# Altium footprint library Semiconductor.PcbLib: 73 footprints (part 4 of 5)
Each footprint in its own frame and in the unit in brackets; x right, y up, seen from the top. Pads: shape width x height; smd on the part's side, far side on the other; paste and mask are expansions set on the pad; w line width, h text height; cw(c..) or ccw(c..) is an arc to the next point about the centre after c.
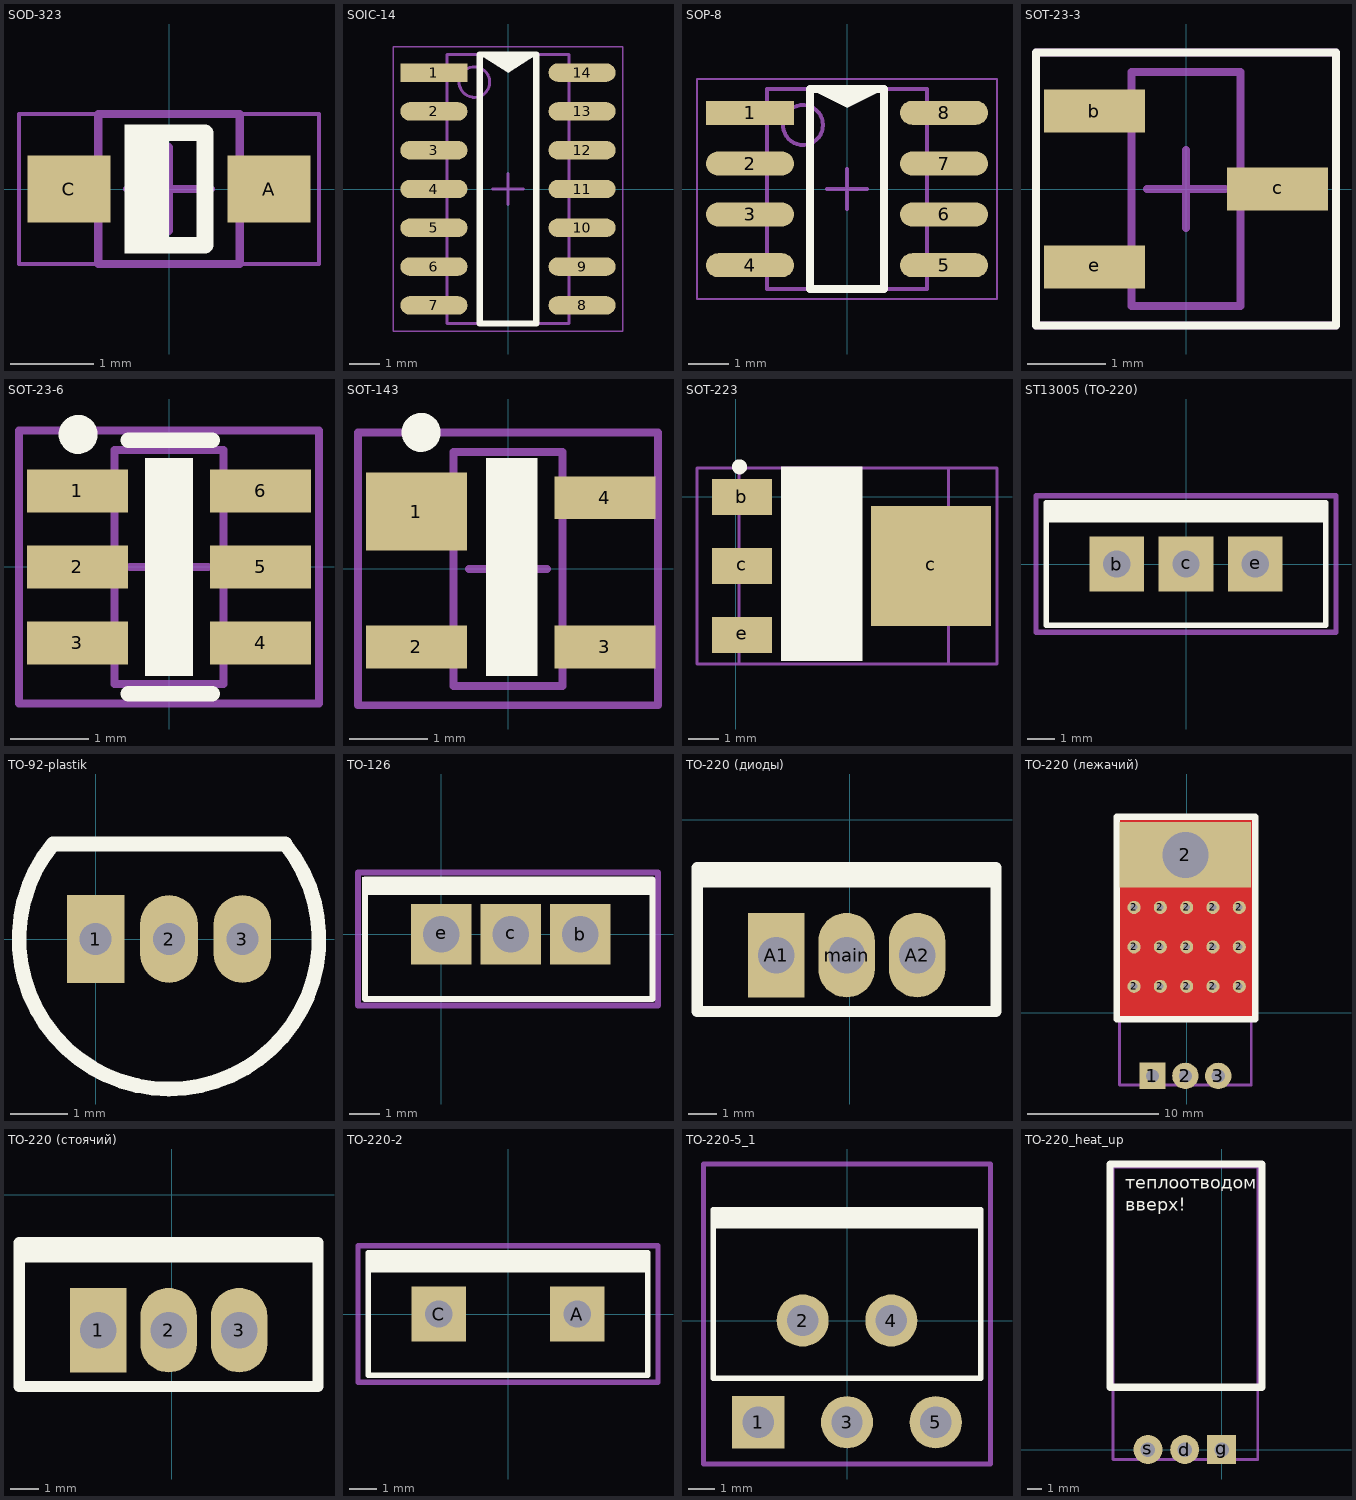
[diagram p3: the footprints below, top view; thin cyan lines are the x and y axes]

## SOD-323 [mm] "SOIC, 2-Leads, Body 2,60x1,60mm, Pitch 1,27mm, IPC Medium Density"
height 1.2
pads (2):
  rect 1x0.8 smd: A(1.2,0) C(-1.2,0)
Top Overlay:
  rectangle: -0.375,-0.675 0,0.675
  rectangle: -0.532,0.573 -0.429,0.776
  rectangle: -0.532,-0.775 -0.385,-0.592
  lines w0.2: -0.432,-0.675 0.432,-0.675 0.432,0.675 -0.432,0.675 -0.432,-0.675
Mechanical 13:
  lines w0.1: -0.85,-0.9 0.85,-0.9 0.85,0.9 -0.85,0.9 -0.85,-0.9
Mechanical 15:
  lines w0.05: -1.8,-0.9 1.8,-0.9 1.8,0.9 -1.8,0.9 -1.8,-0.9
  lines w0.1: -0.5,0 0.5,0 ; 0,-0.5 0,0.5
3D body: height 1.1, standoff 0, extent -1.3,-0.675 1.3,0.675

## SOIC-14 [mm] "SOIC, 14-Leads, Body 8,65x3,90mm, Pitch 1,27mm, IPC Medium Density"
height 1.75
pads (14):
  rect 2.2x0.6 smd: 1(-2.425,3.81)
  oval 2.2x0.6 smd: 2(-2.425,2.54) 3(-2.425,1.27) 4(-2.425,0) 5(-2.425,-1.27) 6(-2.425,-2.54) 7(-2.425,-3.81) 8(2.425,-3.81) 9(2.425,-2.54) 10(2.425,-1.27) 11(2.425,0) 12(2.425,1.27) 13(2.425,2.54) 14(2.425,3.81)
Top Overlay:
  region: -0.925,4.4 0.925,4.4 0,3.81
  lines w0.2: -0.925,-4.4 0.925,-4.4 0.925,4.4 -0.925,4.4 -0.925,-4.4
Mechanical 13:
  circle w0.1: c-1.1,3.5 r0.5
  lines w0.1: -2,-4.4 2,-4.4 2,4.4 -2,4.4 -2,-4.4
Mechanical 15:
  lines w0.05: -3.75,-4.65 3.75,-4.65 3.75,4.65 -3.75,4.65 -3.75,-4.65
  lines w0.1: -0.5,0 0.5,0 ; 0,-0.5 0,0.5
3D body: height 1.55, standoff 0, extent -3,-4.325 3,4.325

## SOP-8 [mm] "SOP, 8-Leads, Body 4,90x3,90mm, Pitch 1,27mm, IPC Medium Density"
height 1.75
pads (8):
  rect 2.2x0.6 smd: 1(-2.425,1.905)
  oval 2.2x0.6 smd: 2(-2.425,0.635) 3(-2.425,-0.635) 4(-2.425,-1.905) 5(2.425,-1.905) 6(2.425,-0.635) 7(2.425,0.635) 8(2.425,1.905)
Top Overlay:
  region: -0.925,2.5 0.925,2.5 0,2.032
  lines w0.2: -0.925,-2.5 0.925,-2.5 0.925,2.5 -0.925,2.5 -0.925,-2.5
Mechanical 13:
  circle w0.1: c-1.1,1.6 r0.5
  lines w0.1: -2,-2.5 2,-2.5 2,2.5 -2,2.5 -2,-2.5
Mechanical 15:
  lines w0.05: -3.75,-2.75 3.75,-2.75 3.75,2.75 -3.75,2.75 -3.75,-2.75
  lines w0.1: -0.5,0 0.5,0 ; 0,-0.5 0,0.5
3D body: height 1.6, standoff 0, extent -3,-2.5 3.042,2.52

## SOT-23-3 [mm]
height 1.1
pads (3):
  rect 1.3x0.55 smd: b(-1.175,1.001) c(1.175,0) e(-1.175,-1.001)
Top Overlay:
  lines w0.1: -1.925,-1.75 -1.925,1.75 1.925,1.75 1.925,-1.7 1.925,-1.75 -1.925,-1.75
Mechanical 13:
  lines w0.1: -0.7,-1.5 -0.7,1.5 0.7,1.5 0.7,-1.5 -0.7,-1.5
Mechanical 15:
  lines w0.1: -0.5,0 0.5,0 ; 0,-0.5 0,0.5 ; -1.925,-1.75 -1.925,1.75 1.925,1.75 1.925,-1.75 -1.925,-1.75
  text ".Designator" at 2.6,0 h1
3D body: height 1.1, standoff 0, extent -1.271,-1.5 1.271,1.5

## SOT-23-6 [mm]
height 1.1
pads (6):
  rect 1.3x0.55 smd: 1(-1.175,0.975) 2(-1.175,0) 3(-1.175,-0.975) 4(1.175,-0.975) 5(1.175,0) 6(1.175,0.975)
Top Overlay:
  circle w0.25: c-1.166,1.702 r0.125
  rectangle: -0.305,-1.397 0.305,1.397
  lines w0.2: -0.524,-1.625 0.555,-1.625 ; -0.524,1.625 0.555,1.625
Mechanical 13:
  lines w0.1: -0.7,-1.5 0.7,-1.5 0.7,1.5 -0.7,1.5 -0.7,-1.5
Mechanical 15:
  lines w0.1: -0.5,0 0.5,0 ; 0,-0.5 0,0.5 ; -1.925,-1.75 1.925,-1.75 1.925,1.75 -1.925,1.75 -1.925,-1.75
3D body: height 1.09, standoff 0, extent -1.213,-1.4 1.213,1.394

## SOT-143 [mm]
height 1.1
pads (4):
  rect 1.3x1 smd: 1(-1.175,0.737)
  rect 1.3x0.55 smd: 2(-1.175,-1.001) 3(1.245,-1.001) 4(1.245,0.914)
Top Overlay:
  circle w0.25: c-1.116,1.753 r0.125
  rectangle: -0.279,-1.372 0.381,1.422
Mechanical 13:
  lines w0.1: -0.7,-1.5 -0.7,1.5 0.7,1.5 0.7,-1.5 -0.7,-1.5
Mechanical 15:
  lines w0.1: -0.5,0 0.5,0 ; 0,-0.5 0,0.5 ; -1.925,-1.75 -1.925,1.75 1.925,1.75 1.925,-1.75 -1.925,-1.75
3D body: height 1, standoff 0, extent -1.108,-1.499 1.312,1.421

## SOT-223 [mm]
height 1.1
pads (4):
  rect 2x1.2 smd: b(0.2,0) c(0.2,-2.3) e(0.2,-4.6)
  rect 4x4 smd: c(6.5,-2.3)
Top Overlay:
  circle w0.25: c0.12,1 r0.125
  rectangle: 1.499,-5.464 4.216,1.013
Mechanical 13:
  lines w0.1: 0.102,-5.565 0.102,0.963 7.087,0.963 7.087,-5.565 0.102,-5.565
Mechanical 15:
  lines w0.1: 3.1,-2.25 4.1,-2.25 ; 3.6,-2.75 3.6,-1.75 ; -1.295,-5.565 -1.295,0.963 8.7,0.963 8.7,-5.565 -1.295,-5.565
3D body: height 1.7, standoff 0.02, extent 0.12,-5.5 7.08,1

## ST13005 (TO-220) [mm] "Два выпрямительных скоростных диода в корпусе TO-220"
pads (3):
  rect 2x2 hole 1: b(-2.54,0) c(0,0) e(2.54,0)
Top Overlay:
  lines w0.2: -5.125,1.625 5.125,1.625 ; -5.125,1.75 5,1.75 5.125,1.875 -5,1.875 -5,2.125 5.125,2.125 ; -5.125,2 5.125,2 ; -5.125,-2.25 -5.125,2.25 5.125,2.25 5.125,-2.25 -5.125,-2.25
Mechanical 15:
  lines w0.2: -5.5,-2.5 -5.5,2.5 5.5,2.5 5.5,-2.5 -5.5,-2.5
3D body: height 18.8, standoff -2.88, extent -4.826,-2.25 4.826,2.25

## TO-92-plastik [mm]
pads (3):
  rect 1x1.524 hole 0.55: 1(0,0)
  oval 1x1.524 hole 0.55: 2(1.275,0) 3(2.55,0)
Top Overlay:
  lines w0.254: 3.294,1.646 cw(c1.275,0) -0.74,1.651 3.294,1.651
3D body: height 10.55, standoff -3.65, extent -1.12,-2.349 3.674,1.651

## TO-126 [mm] "KT815 BD139"
pads (3):
  rect 2x2 hole 1.2: b(4.58,0) c(2.29,0) e(0,0)
Top Overlay:
  rectangle: -2.616,1.295 6.96,1.886
  lines w0.2: -2.515,-2.134 6.96,-2.134 6.96,1.803 -2.515,1.803 -2.515,-2.134
Mechanical 15:
  lines w0.2: -2.743,-2.337 7.137,-2.337 7.137,2.032 -2.743,2.032 -2.743,-2.337
3D body: height 16.6, standoff -1.35, extent -1.666,-1.85 6.134,0.851

## TO-220 (диоды) [mm]
pads (3):
  rect 2x3 hole 1.3: A1(-2.6,-4.8)
  oval 2x3 hole 1.3: A2(2.4,-4.8) main(-0.1,-4.8)
Top Overlay:
  rectangle: -5.4,-2.4 5.2,-1.7
  lines w0.4: -5.4,-6.8 5.2,-6.8 5.2,-1.7 -5.4,-1.7 -5.4,-6.8
Mechanical 15:
  lines w0.2: -5.41,-6.8 5.206,-6.8 5.232,-1.651 -5.41,-1.651 -5.41,-6.8
3D body: height 28.26, standoff -2.73, extent -5.438,-6.456 5.232,-1.626

## TO-220 (лежачий) [mm]
pads (19):
  rect 2x2 hole 1: 1(-2.6,-4.8)
  round 1 hole 0.5: 2(-4,2) 2(-4,5) 2(-4,8) 2(-2,2) 2(-2,5) 2(-2,8) 2(0,2) 2(0,5) 2(0,8) 2(2,2) 2(2,5) 2(2,8) 2(4,2) 2(4,5) 2(4,8)
  round 2 hole 1: 2(-0.1,-4.8) 3(2.4,-4.8)
  rect 10x5 hole 3.5: 2(-0.1,12)
Top Layer:
  rectangle: -5.3,-0.5 5.2,15
Top Overlay:
  circle w0.2: c-0.1,12 r2
  lines w0.5: -5.3,-0.5 -5.3,14.9 5.2,14.9 5.2,-0.5 -5.3,-0.5
Mechanical 15:
  lines w0.2: -5.1,-5.5 4.9,-5.5 4.9,14.7 -5.1,14.7 -5.1,-5.5
3D body: height 4.7, standoff -2.8, extent -5.1,-5.052 4.9,14.652

## TO-220 (стоячий) [mm]
pads (3):
  rect 2x3 hole 1.3: 1(-2.6,-4.8)
  oval 2x3 hole 1.3: 2(-0.1,-4.8) 3(2.4,-4.8)
Top Overlay:
  rectangle: -5.4,-2.4 5.2,-1.7
  lines w0.4: -5.4,-6.8 -5.4,-1.7 5.2,-1.7 5.2,-6.8 -5.4,-6.8
Mechanical 15:
  lines w0.2: -5.41,-6.8 -5.41,-1.651 5.232,-1.651 5.206,-6.8 -5.41,-6.8
3D body: height 28.26, standoff -2.73, extent -5.438,-6.456 5.232,-1.626

## TO-220-2 [mm]
pads (2):
  rect 2x2 hole 1: A(2.54,0) C(-2.54,0)
Top Overlay:
  lines w0.2: -5.125,1.625 5.125,1.625 ; -5.125,1.75 5,1.75 5.125,1.875 -5,1.875 -5,2.125 5.125,2.125 ; -5.125,2 5.125,2 ; -5.125,-2.25 5.125,-2.25 5.125,2.25 -5.125,2.25 -5.125,-2.25
Mechanical 15:
  lines w0.2: -5.5,-2.5 5.5,-2.5 5.5,2.5 -5.5,2.5 -5.5,-2.5
3D body: height 18.8, standoff -2.8, extent -4.826,-2.25 4.826,2.25

## TO-220-5_1 [mm]
pads (5):
  rect 2x2 hole 1.2: 1(-3.4,-3.9)
  round 2 hole 1.2: 2(-1.7,0) 3(0,-3.9) 4(1.7,0) 5(3.4,-3.9)
Top Overlay:
  lines w0.2: -5.125,3.625 5.125,3.625 ; -5.125,3.75 5,3.75 5.125,3.875 -5,3.875 -5,4.125 5.125,4.125 ; -5.125,4 5.125,4 ; -5.125,-2.21 5.125,-2.21 5.125,4.25 -5.125,4.25 -5.125,-2.21
Mechanical 15:
  lines w0.2: -5.5,-5.5 5.5,-5.5 5.5,6 -5.5,6 -5.5,-5.5
3D body: height 21.35, standoff -2.64, extent -5.105,-4.074 5.055,4.166

## TO-220_heat_up [mm]
height 5
pads (3):
  round 2 hole 1: d(-2.54,0) s(-5.08,0)
  rect 2x2 hole 1: g(0,0)
Top Overlay:
  lines w0.5: -7.7,4.3 2.8,4.3 2.8,19.7 -7.7,19.7 -7.7,4.3
  text "теплоотводом / вверх!" at -6.656,16.174 h1.52
Mechanical 15:
  lines w0.2: -7.5,-0.7 -7.5,19.5 2.5,19.5 2.5,-0.7 -7.5,-0.7
3D body: height 4.6, standoff -3.6, extent -7.54,-0.178 2.46,19.526